# Altium footprint library LION.PcbLib: 90 footprints (part 6 of 13)
Each footprint in its own frame and in the unit in brackets; x right, y up, seen from the top. Pads: shape width x height; smd on the part's side, far side on the other; paste and mask are expansions set on the pad; w line width, h text height; cw(c..) or ccw(c..) is an arc to the next point about the centre after c.
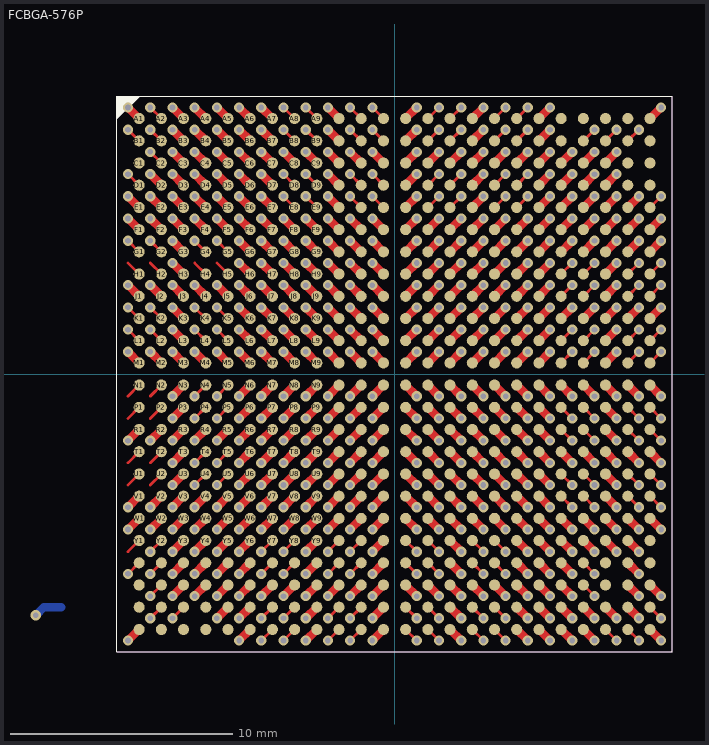
[diagram p5: the footprint, top view; thin cyan lines are the x and y axes]

## FCBGA-576P [mil] "FCBGA-576P"
pads (576):
  round 19.69 smd: A1(-452.76,452.76) A2(-413.39,452.76) A3(-374.02,452.76) A4(-334.65,452.76) A5(-295.28,452.76) A6(-255.91,452.76) A7(-216.54,452.76) A8(-177.17,452.76) A9(-137.8,452.76) A10(-98.43,452.76) A11(-59.06,452.76) A12(-19.69,452.76) A13(19.69,452.76) A14(59.06,452.76) A15(98.43,452.76) A16(137.8,452.76) A17(177.17,452.76) A18(216.54,452.76) A19(255.91,452.76) A20(295.28,452.76) A21(334.65,452.76) A22(374.02,452.76) A23(413.39,452.76) A24(452.76,452.76) AA1(-452.76,-334.65) AA2(-413.39,-334.65) AA3(-374.02,-334.65) AA4(-334.65,-334.65) AA5(-295.28,-334.65) AA6(-255.91,-334.65) AA7(-216.54,-334.65) AA8(-177.17,-334.65) AA9(-137.8,-334.65) AA10(-98.43,-334.65) AA11(-59.06,-334.65) AA12(-19.69,-334.65) AA13(19.69,-334.65) AA14(59.06,-334.65) AA15(98.43,-334.65) AA16(137.8,-334.65) AA17(177.17,-334.65) AA18(216.54,-334.65) AA19(255.91,-334.65) AA20(295.28,-334.65) AA21(334.65,-334.65) AA22(374.02,-334.65) AA23(413.39,-334.65) AA24(452.76,-334.65) AB1(-452.76,-374.02) AB2(-413.39,-374.02) AB3(-374.02,-374.02) AB4(-334.65,-374.02) AB5(-295.28,-374.02) AB6(-255.91,-374.02) AB7(-216.54,-374.02) AB8(-177.17,-374.02) AB9(-137.8,-374.02) AB10(-98.43,-374.02) AB11(-59.06,-374.02) AB12(-19.69,-374.02) AB13(19.69,-374.02) AB14(59.06,-374.02) AB15(98.43,-374.02) AB16(137.8,-374.02) AB17(177.17,-374.02) AB18(216.54,-374.02) AB19(255.91,-374.02) AB20(295.28,-374.02) AB21(334.65,-374.02) AB22(374.02,-374.02) AB23(413.39,-374.02) AB24(452.76,-374.02) AC1(-452.76,-413.39) AC2(-413.39,-413.39) AC3(-374.02,-413.39) AC4(-334.65,-413.39) AC5(-295.28,-413.39) AC6(-255.91,-413.39) AC7(-216.54,-413.39) AC8(-177.17,-413.39) AC9(-137.8,-413.39) AC10(-98.43,-413.39) AC11(-59.06,-413.39) AC12(-19.69,-413.39) AC13(19.69,-413.39) AC14(59.06,-413.39) AC15(98.43,-413.39) AC16(137.8,-413.39) AC17(177.17,-413.39) AC18(216.54,-413.39) AC19(255.91,-413.39) AC20(295.28,-413.39) AC21(334.65,-413.39) AC22(374.02,-413.39) AC23(413.39,-413.39) AC24(452.76,-413.39) AD1(-452.76,-452.76) AD2(-413.39,-452.76) AD3(-374.02,-452.76) AD4(-334.65,-452.76) AD5(-295.28,-452.76) AD6(-255.91,-452.76) AD7(-216.54,-452.76) AD8(-177.17,-452.76) AD9(-137.8,-452.76) AD10(-98.43,-452.76) AD11(-59.06,-452.76) AD12(-19.69,-452.76) AD13(19.69,-452.76) AD14(59.06,-452.76) AD15(98.43,-452.76) AD16(137.8,-452.76) AD17(177.17,-452.76) AD18(216.54,-452.76) AD19(255.91,-452.76) AD20(295.28,-452.76) AD21(334.65,-452.76) AD22(374.02,-452.76) AD23(413.39,-452.76) AD24(452.76,-452.76) B1(-452.76,413.39) B2(-413.39,413.39) B3(-374.02,413.39) B4(-334.65,413.39) B5(-295.28,413.39) B6(-255.91,413.39) B7(-216.54,413.39) B8(-177.17,413.39) B9(-137.8,413.39) B10(-98.43,413.39) B11(-59.06,413.39) B12(-19.69,413.39) B13(19.69,413.39) B14(59.06,413.39) B15(98.43,413.39) B16(137.8,413.39) B17(177.17,413.39) B18(216.54,413.39) B19(255.91,413.39) B20(295.28,413.39) B21(334.65,413.39) B22(374.02,413.39) B23(413.39,413.39) B24(452.76,413.39) C1(-452.76,374.02) C2(-413.39,374.02) C3(-374.02,374.02) C4(-334.65,374.02) C5(-295.28,374.02) C6(-255.91,374.02) C7(-216.54,374.02) C8(-177.17,374.02) C9(-137.8,374.02) C10(-98.43,374.02) C11(-59.06,374.02) C12(-19.69,374.02) C13(19.69,374.02) C14(59.06,374.02) C15(98.43,374.02) C16(137.8,374.02) C17(177.17,374.02) C18(216.54,374.02) C19(255.91,374.02) C20(295.28,374.02) C21(334.65,374.02) C22(374.02,374.02) C23(413.39,374.02) C24(452.76,374.02) D1(-452.76,334.65) D2(-413.39,334.65) D3(-374.02,334.65) D4(-334.65,334.65) D5(-295.28,334.65) D6(-255.91,334.65) D7(-216.54,334.65) D8(-177.17,334.65) D9(-137.8,334.65) D10(-98.43,334.65) D11(-59.06,334.65) D12(-19.69,334.65) D13(19.69,334.65) D14(59.06,334.65) D15(98.43,334.65) D16(137.8,334.65) D17(177.17,334.65) D18(216.54,334.65) D19(255.91,334.65) D20(295.28,334.65) D21(334.65,334.65) D22(374.02,334.65) D23(413.39,334.65) D24(452.76,334.65) E1(-452.76,295.28) E2(-413.39,295.28) E3(-374.02,295.28) E4(-334.65,295.28) E5(-295.28,295.28) E6(-255.91,295.28) E7(-216.54,295.28) E8(-177.17,295.28) E9(-137.8,295.28) E10(-98.43,295.28) E11(-59.06,295.28) E12(-19.69,295.28) E13(19.69,295.28) E14(59.06,295.28) E15(98.43,295.28) E16(137.8,295.28) E17(177.17,295.28) E18(216.54,295.28) E19(255.91,295.28) E20(295.28,295.28) E21(334.65,295.28) E22(374.02,295.28) E23(413.39,295.28) E24(452.76,295.28) F1(-452.76,255.91) F2(-413.39,255.91) F3(-374.02,255.91) F4(-334.65,255.91) F5(-295.28,255.91) F6(-255.91,255.91) F7(-216.54,255.91) F8(-177.17,255.91) F9(-137.8,255.91) F10(-98.43,255.91) F11(-59.06,255.91) F12(-19.69,255.91) F13(19.69,255.91) F14(59.06,255.91) F15(98.43,255.91) F16(137.8,255.91) F17(177.17,255.91) F18(216.54,255.91) F19(255.91,255.91) F20(295.28,255.91) F21(334.65,255.91) F22(374.02,255.91) F23(413.39,255.91) F24(452.76,255.91) G1(-452.76,216.54) G2(-413.39,216.54) G3(-374.02,216.54) G4(-334.65,216.54) G5(-295.28,216.54) G6(-255.91,216.54) G7(-216.54,216.54) G8(-177.17,216.54) G9(-137.8,216.54) G10(-98.43,216.54) G11(-59.06,216.54) G12(-19.69,216.54) G13(19.69,216.54) G14(59.06,216.54) G15(98.43,216.54) G16(137.8,216.54) G17(177.17,216.54) G18(216.54,216.54) G19(255.91,216.54) G20(295.28,216.54) G21(334.65,216.54) G22(374.02,216.54) G23(413.39,216.54) G24(452.76,216.54) H1(-452.76,177.17) H2(-413.39,177.17) H3(-374.02,177.17) H4(-334.65,177.17) H5(-295.28,177.17) H6(-255.91,177.17) H7(-216.54,177.17) H8(-177.17,177.17) H9(-137.8,177.17) H10(-98.43,177.17) H11(-59.06,177.17) H12(-19.69,177.17) H13(19.69,177.17) H14(59.06,177.17) H15(98.43,177.17) H16(137.8,177.17) H17(177.17,177.17) H18(216.54,177.17) H19(255.91,177.17) H20(295.28,177.17) H21(334.65,177.17) H22(374.02,177.17) H23(413.39,177.17) H24(452.76,177.17) J1(-452.76,137.8) J2(-413.39,137.8) J3(-374.02,137.8) J4(-334.65,137.8) J5(-295.28,137.8) J6(-255.91,137.8) J7(-216.54,137.8) J8(-177.17,137.8) J9(-137.8,137.8) J10(-98.43,137.8) J11(-59.06,137.8) J12(-19.69,137.8) J13(19.69,137.8) J14(59.06,137.8) J15(98.43,137.8) J16(137.8,137.8) J17(177.17,137.8) J18(216.54,137.8) J19(255.91,137.8) J20(295.28,137.8) J21(334.65,137.8) J22(374.02,137.8) J23(413.39,137.8) J24(452.76,137.8) K1(-452.76,98.43) K2(-413.39,98.43) K3(-374.02,98.43) K4(-334.65,98.43) K5(-295.28,98.43) K6(-255.91,98.43) K7(-216.54,98.43) K8(-177.17,98.43) K9(-137.8,98.43) K10(-98.43,98.43) K11(-59.06,98.43) K12(-19.69,98.43) K13(19.69,98.43) K14(59.06,98.43) K15(98.43,98.43) K16(137.8,98.43) K17(177.17,98.43) K18(216.54,98.43) K19(255.91,98.43) K20(295.28,98.43) K21(334.65,98.43) K22(374.02,98.43) K23(413.39,98.43) K24(452.76,98.43) L1(-452.76,59.06) L2(-413.39,59.06) L3(-374.02,59.06) L4(-334.65,59.06) L5(-295.28,59.06) L6(-255.91,59.06) L7(-216.54,59.06) L8(-177.17,59.06) L9(-137.8,59.06) L10(-98.43,59.06) L11(-59.06,59.06) L12(-19.69,59.06) L13(19.69,59.06) L14(59.06,59.06) L15(98.43,59.06) L16(137.8,59.06) L17(177.17,59.06) L18(216.54,59.06) L19(255.91,59.06) L20(295.28,59.06) L21(334.65,59.06) L22(374.02,59.06) L23(413.39,59.06) L24(452.76,59.06) M1(-452.76,19.69) M2(-413.39,19.69) M3(-374.02,19.69) M4(-334.65,19.69) M5(-295.28,19.69) M6(-255.91,19.69) M7(-216.54,19.69) M8(-177.17,19.69) M9(-137.8,19.69) M10(-98.43,19.69) M11(-59.06,19.69) M12(-19.69,19.69) M13(19.69,19.69) M14(59.06,19.69) M15(98.43,19.69) M16(137.8,19.69) M17(177.17,19.69) M18(216.54,19.69) M19(255.91,19.69) M20(295.28,19.69) M21(334.65,19.69) M22(374.02,19.69) M23(413.39,19.69) M24(452.76,19.69) N1(-452.76,-19.69) N2(-413.39,-19.69) N3(-374.02,-19.69) N4(-334.65,-19.69) N5(-295.28,-19.69) N6(-255.91,-19.69) N7(-216.54,-19.69) N8(-177.17,-19.69) N9(-137.8,-19.69) N10(-98.43,-19.69) N11(-59.06,-19.69) N12(-19.69,-19.69) N13(19.69,-19.69) N14(59.06,-19.69) N15(98.43,-19.69) N16(137.8,-19.69) N17(177.17,-19.69) N18(216.54,-19.69) N19(255.91,-19.69) N20(295.28,-19.69) N21(334.65,-19.69) N22(374.02,-19.69) N23(413.39,-19.69) N24(452.76,-19.69) P1(-452.76,-59.06) P2(-413.39,-59.06) P3(-374.02,-59.06) P4(-334.65,-59.06) P5(-295.28,-59.06) P6(-255.91,-59.06) P7(-216.54,-59.06) P8(-177.17,-59.06) P9(-137.8,-59.06) P10(-98.43,-59.06) P11(-59.06,-59.06) P12(-19.69,-59.06) P13(19.69,-59.06) P14(59.06,-59.06) P15(98.43,-59.06) P16(137.8,-59.06) P17(177.17,-59.06) P18(216.54,-59.06) P19(255.91,-59.06) P20(295.28,-59.06) P21(334.65,-59.06) P22(374.02,-59.06) P23(413.39,-59.06) P24(452.76,-59.06) R1(-452.76,-98.43) R2(-413.39,-98.43) R3(-374.02,-98.43) R4(-334.65,-98.43) R5(-295.28,-98.43) R6(-255.91,-98.43) R7(-216.54,-98.43) R8(-177.17,-98.43) R9(-137.8,-98.43) R10(-98.43,-98.43) R11(-59.06,-98.43) R12(-19.69,-98.43) R13(19.69,-98.43) R14(59.06,-98.43) R15(98.43,-98.43) R16(137.8,-98.43) R17(177.17,-98.43) R18(216.54,-98.43) R19(255.91,-98.43) R20(295.28,-98.43) R21(334.65,-98.43) R22(374.02,-98.43) R23(413.39,-98.43) R24(452.76,-98.43) T1(-452.76,-137.8) T2(-413.39,-137.8) T3(-374.02,-137.8) T4(-334.65,-137.8) T5(-295.28,-137.8) T6(-255.91,-137.8) T7(-216.54,-137.8) T8(-177.17,-137.8) T9(-137.8,-137.8) T10(-98.43,-137.8) T11(-59.06,-137.8) T12(-19.69,-137.8) T13(19.69,-137.8) T14(59.06,-137.8) T15(98.43,-137.8) T16(137.8,-137.8) T17(177.17,-137.8) T18(216.54,-137.8) T19(255.91,-137.8) T20(295.28,-137.8) T21(334.65,-137.8) T22(374.02,-137.8) T23(413.39,-137.8) T24(452.76,-137.8) U1(-452.76,-177.17) U2(-413.39,-177.17) U3(-374.02,-177.17) U4(-334.65,-177.17) U5(-295.28,-177.17) U6(-255.91,-177.17) U7(-216.54,-177.17) U8(-177.17,-177.17) U9(-137.8,-177.17) U10(-98.43,-177.17) U11(-59.06,-177.17) U12(-19.69,-177.17) U13(19.69,-177.17) U14(59.06,-177.17) U15(98.43,-177.17) U16(137.8,-177.17) U17(177.17,-177.17) U18(216.54,-177.17) U19(255.91,-177.17) U20(295.28,-177.17) U21(334.65,-177.17) U22(374.02,-177.17) U23(413.39,-177.17) U24(452.76,-177.17) V1(-452.76,-216.54) V2(-413.39,-216.54) V3(-374.02,-216.54) V4(-334.65,-216.54) V5(-295.28,-216.54) V6(-255.91,-216.54) V7(-216.54,-216.54) V8(-177.17,-216.54) V9(-137.8,-216.54) V10(-98.43,-216.54) V11(-59.06,-216.54) V12(-19.69,-216.54) V13(19.69,-216.54) V14(59.06,-216.54) V15(98.43,-216.54) V16(137.8,-216.54) V17(177.17,-216.54) V18(216.54,-216.54) V19(255.91,-216.54) V20(295.28,-216.54) V21(334.65,-216.54) V22(374.02,-216.54) V23(413.39,-216.54) V24(452.76,-216.54) W1(-452.76,-255.91) W2(-413.39,-255.91) W3(-374.02,-255.91) W4(-334.65,-255.91) W5(-295.28,-255.91) W6(-255.91,-255.91) W7(-216.54,-255.91) W8(-177.17,-255.91) W9(-137.8,-255.91) W10(-98.43,-255.91) W11(-59.06,-255.91) W12(-19.69,-255.91) W13(19.69,-255.91) W14(59.06,-255.91) W15(98.43,-255.91) W16(137.8,-255.91) W17(177.17,-255.91) W18(216.54,-255.91) W19(255.91,-255.91) W20(295.28,-255.91) W21(334.65,-255.91) W22(374.02,-255.91) W23(413.39,-255.91) W24(452.76,-255.91) Y1(-452.76,-295.28) Y2(-413.39,-295.28) Y3(-374.02,-295.28) Y4(-334.65,-295.28) Y5(-295.28,-295.28) Y6(-255.91,-295.28) Y7(-216.54,-295.28) Y8(-177.17,-295.28) Y9(-137.8,-295.28) Y10(-98.43,-295.28) Y11(-59.06,-295.28) Y12(-19.69,-295.28) Y13(19.69,-295.28) Y14(59.06,-295.28) Y15(98.43,-295.28) Y16(137.8,-295.28) Y17(177.17,-295.28) Y18(216.54,-295.28) Y19(255.91,-295.28) Y20(295.28,-295.28) Y21(334.65,-295.28) Y22(374.02,-295.28) Y23(413.39,-295.28) Y24(452.76,-295.28)
via -433.07,236.22 diameter 18 hole 10
via -472.44,118.11 diameter 18 hole 10
via -433.07,118.11 diameter 18 hole 10
via -472.44,236.22 diameter 18 hole 10
via -472.44,78.74 diameter 18 hole 10
via -433.07,78.74 diameter 18 hole 10
via -196.85,-314.96 diameter 18 hole 10
via -78.74,-354.33 diameter 18 hole 10
via -236.22,-354.33 diameter 18 hole 10
via -118.11,-354.33 diameter 18 hole 10
via -78.74,-314.96 diameter 18 hole 10
via -196.85,-354.33 diameter 18 hole 10
via -118.11,-314.96 diameter 18 hole 10
via -236.22,-314.96 diameter 18 hole 10
via 433.07,-196.85 diameter 18 hole 10
via 472.44,-196.85 diameter 18 hole 10
via 433.07,-118.11 diameter 18 hole 10
via 472.44,-118.11 diameter 18 hole 10
via 472.44,-78.74 diameter 18 hole 10
via 433.07,-78.74 diameter 18 hole 10
via 472.44,-236.22 diameter 18 hole 10
via 433.07,-236.22 diameter 18 hole 10
via -196.85,472.44 diameter 18 hole 10
via -196.85,433.07 diameter 18 hole 10
via -157.48,472.44 diameter 18 hole 10
via -157.48,433.07 diameter 18 hole 10
via -78.74,472.44 diameter 18 hole 10
via -78.74,433.07 diameter 18 hole 10
via -39.37,472.44 diameter 18 hole 10
via -39.37,433.07 diameter 18 hole 10
via 472.44,196.85 diameter 18 hole 10
via 433.07,196.85 diameter 18 hole 10
via 472.44,157.48 diameter 18 hole 10
via 433.07,157.48 diameter 18 hole 10
via 472.44,78.74 diameter 18 hole 10
via 433.07,78.74 diameter 18 hole 10
via 472.44,39.37 diameter 18 hole 10
via 433.07,39.37 diameter 18 hole 10
via 78.74,472.44 diameter 18 hole 10
via 78.74,433.07 diameter 18 hole 10
via 118.11,472.44 diameter 18 hole 10
via 118.11,433.07 diameter 18 hole 10
via 196.85,472.44 diameter 18 hole 10
via 196.85,433.07 diameter 18 hole 10
via 236.22,472.44 diameter 18 hole 10
via 236.22,433.07 diameter 18 hole 10
via 39.37,-314.96 diameter 18 hole 10
via -314.96,78.74 diameter 18 hole 10
via 78.74,314.96 diameter 18 hole 10
via -354.33,-78.74 diameter 18 hole 10
via -314.96,-196.85 diameter 18 hole 10
via -39.37,314.96 diameter 18 hole 10
via 314.96,78.74 diameter 18 hole 10
via 354.33,39.37 diameter 18 hole 10
via -78.74,354.33 diameter 18 hole 10
via -354.33,236.22 diameter 18 hole 10
via 39.37,-354.33 diameter 18 hole 10
via 314.96,39.37 diameter 18 hole 10
via 314.96,-118.11 diameter 18 hole 10
via 354.33,196.85 diameter 18 hole 10
via -157.48,354.33 diameter 18 hole 10
via -314.96,-78.74 diameter 18 hole 10
via 354.33,-78.74 diameter 18 hole 10
via 236.22,354.33 diameter 18 hole 10
via 354.33,-393.7 diameter 18 hole 10
via -39.37,354.33 diameter 18 hole 10
via 354.33,157.48 diameter 18 hole 10
via -472.44,-354.33 diameter 18 hole 10
via 157.48,-314.96 diameter 18 hole 10
via -196.85,354.33 diameter 18 hole 10
via -314.96,118.11 diameter 18 hole 10
via -314.96,-39.37 diameter 18 hole 10
via 354.33,78.74 diameter 18 hole 10
via 78.74,-354.33 diameter 18 hole 10
via 354.33,-354.33 diameter 18 hole 10
via 196.85,314.96 diameter 18 hole 10
via 78.74,-314.96 diameter 18 hole 10
via 196.85,-314.96 diameter 18 hole 10
via -157.48,314.96 diameter 18 hole 10
via -78.74,314.96 diameter 18 hole 10
via -314.96,-157.48 diameter 18 hole 10
via -433.07,433.07 diameter 18 hole 10
via 314.96,-78.74 diameter 18 hole 10
via 314.96,-196.85 diameter 18 hole 10
via -433.07,-354.33 diameter 18 hole 10
via -433.07,-393.7 diameter 18 hole 10
via 118.11,314.96 diameter 18 hole 10
via -433.07,-433.07 diameter 18 hole 10
via -354.33,118.11 diameter 18 hole 10
via -354.33,-157.48 diameter 18 hole 10
via -354.33,-39.37 diameter 18 hole 10
via 118.11,354.33 diameter 18 hole 10
via -354.33,-196.85 diameter 18 hole 10
via 354.33,-236.22 diameter 18 hole 10
via 314.96,196.85 diameter 18 hole 10
via -354.33,78.74 diameter 18 hole 10
via 354.33,-118.11 diameter 18 hole 10
via -393.7,-433.07 diameter 18 hole 10
via -196.85,314.96 diameter 18 hole 10
via -314.96,236.22 diameter 18 hole 10
via 157.48,-354.33 diameter 18 hole 10
via -472.44,433.07 diameter 18 hole 10
via 314.96,157.48 diameter 18 hole 10
via 78.74,354.33 diameter 18 hole 10
via 236.22,314.96 diameter 18 hole 10
via -433.07,472.44 diameter 18 hole 10
via -472.44,354.33 diameter 18 hole 10
via 196.85,-354.33 diameter 18 hole 10
via -433.07,393.7 diameter 18 hole 10
via 314.96,-236.22 diameter 18 hole 10
via 354.33,-196.85 diameter 18 hole 10
via 196.85,354.33 diameter 18 hole 10
via -275.59,-433.07 diameter 18 hole 10
via -275.59,-472.44 diameter 18 hole 10
via -157.48,-472.44 diameter 18 hole 10
via -157.48,-433.07 diameter 18 hole 10
via -39.37,-433.07 diameter 18 hole 10
via -39.37,-472.44 diameter 18 hole 10
via 118.11,-433.07 diameter 18 hole 10
via 118.11,-472.44 diameter 18 hole 10
via 236.22,-472.44 diameter 18 hole 10
via 236.22,-433.07 diameter 18 hole 10
via -433.07,-236.22 diameter 18 hole 10
via -433.07,-118.11 diameter 18 hole 10
via -472.44,-118.11 diameter 18 hole 10
via -472.44,-236.22 diameter 18 hole 10
via 433.07,-275.59 diameter 18 hole 10
via 472.44,-275.59 diameter 18 hole 10
via 433.07,-157.48 diameter 18 hole 10
via 472.44,-157.48 diameter 18 hole 10
via -433.07,157.48 diameter 18 hole 10
via -472.44,157.48 diameter 18 hole 10
via -472.44,39.37 diameter 18 hole 10
via -433.07,39.37 diameter 18 hole 10
via 472.44,236.22 diameter 18 hole 10
via 433.07,236.22 diameter 18 hole 10
via 433.07,118.11 diameter 18 hole 10
via 472.44,118.11 diameter 18 hole 10
via -472.44,275.59 diameter 18 hole 10
via -433.07,275.59 diameter 18 hole 10
via -118.11,472.44 diameter 18 hole 10
via -118.11,433.07 diameter 18 hole 10
via 39.37,472.44 diameter 18 hole 10
via 39.37,433.07 diameter 18 hole 10
via -236.22,433.07 diameter 18 hole 10
via -236.22,472.44 diameter 18 hole 10
via 157.48,472.44 diameter 18 hole 10
via 275.59,472.44 diameter 18 hole 10
via 275.59,433.07 diameter 18 hole 10
via 157.48,433.07 diameter 18 hole 10
via 433.07,-39.37 diameter 18 hole 10
via 472.44,-39.37 diameter 18 hole 10
via -354.33,-275.59 diameter 18 hole 10
via -314.96,-275.59 diameter 18 hole 10
via -157.48,-314.96 diameter 18 hole 10
via -157.48,-354.33 diameter 18 hole 10
via -157.48,-275.59 diameter 18 hole 10
via 118.11,-354.33 diameter 18 hole 10
via 118.11,-314.96 diameter 18 hole 10
via 118.11,-275.59 diameter 18 hole 10
via 275.59,-157.48 diameter 18 hole 10
via 275.59,-314.96 diameter 18 hole 10
via -314.96,-118.11 diameter 18 hole 10
via -354.33,-118.11 diameter 18 hole 10
via -275.59,-118.11 diameter 18 hole 10
via 275.59,-354.33 diameter 18 hole 10
via 433.07,-393.7 diameter 18 hole 10
via 433.07,-354.33 diameter 18 hole 10
via -314.96,314.96 diameter 18 hole 10
via -275.59,314.96 diameter 18 hole 10
via 157.48,275.59 diameter 18 hole 10
via -118.11,275.59 diameter 18 hole 10
via 157.48,314.96 diameter 18 hole 10
via 157.48,354.33 diameter 18 hole 10
via -118.11,314.96 diameter 18 hole 10
via -118.11,354.33 diameter 18 hole 10
via -354.33,157.48 diameter 18 hole 10
via -314.96,157.48 diameter 18 hole 10
via -275.59,157.48 diameter 18 hole 10
via 314.96,-157.48 diameter 18 hole 10
via 354.33,-157.48 diameter 18 hole 10
via 275.59,118.11 diameter 18 hole 10
via 314.96,118.11 diameter 18 hole 10
via 354.33,118.11 diameter 18 hole 10
via 354.33,275.59 diameter 18 hole 10
via 314.96,275.59 diameter 18 hole 10
via -275.59,-275.59 diameter 18 hole 10
via -275.59,-314.96 diameter 18 hole 10
via -275.59,-354.33 diameter 18 hole 10
via -354.33,-236.22 diameter 18 hole 10
via -314.96,-236.22 diameter 18 hole 10
via 236.22,-314.96 diameter 18 hole 10
via 236.22,-354.33 diameter 18 hole 10
via 393.7,-314.96 diameter 18 hole 10
via 314.96,-275.59 diameter 18 hole 10
via 354.33,-275.59 diameter 18 hole 10
via 275.59,-275.59 diameter 18 hole 10
via -39.37,-275.59 diameter 18 hole 10
via -39.37,-354.33 diameter 18 hole 10
via -39.37,-314.96 diameter 18 hole 10
via -236.22,354.33 diameter 18 hole 10
via -236.22,314.96 diameter 18 hole 10
via -275.59,275.59 diameter 18 hole 10
via -354.33,275.59 diameter 18 hole 10
via -314.96,275.59 diameter 18 hole 10
via -393.7,314.96 diameter 18 hole 10
via -275.59,39.37 diameter 18 hole 10
via -314.96,39.37 diameter 18 hole 10
via -354.33,39.37 diameter 18 hole 10
via 275.59,314.96 diameter 18 hole 10
via 275.59,275.59 diameter 18 hole 10
via 275.59,354.33 diameter 18 hole 10
via 39.37,354.33 diameter 18 hole 10
via 39.37,314.96 diameter 18 hole 10
via 39.37,275.59 diameter 18 hole 10
via 275.59,-39.37 diameter 18 hole 10
via 314.96,-39.37 diameter 18 hole 10
via 354.33,-39.37 diameter 18 hole 10
via 314.96,236.22 diameter 18 hole 10
via 354.33,236.22 diameter 18 hole 10
via -118.11,-236.22 diameter 18 hole 10
via -78.74,-236.22 diameter 18 hole 10
via -196.85,-157.48 diameter 18 hole 10
via -157.48,-157.48 diameter 18 hole 10
via -157.48,-196.85 diameter 18 hole 10
via -236.22,-236.22 diameter 18 hole 10
via -196.85,-196.85 diameter 18 hole 10
via -78.74,-78.74 diameter 18 hole 10
via -78.74,-118.11 diameter 18 hole 10
via -118.11,-78.74 diameter 18 hole 10
via -118.11,-118.11 diameter 18 hole 10
via -236.22,78.74 diameter 18 hole 10
via -236.22,-78.74 diameter 18 hole 10
via -118.11,78.74 diameter 18 hole 10
via -118.11,118.11 diameter 18 hole 10
via -157.48,39.37 diameter 18 hole 10
via -196.85,39.37 diameter 18 hole 10
via -78.74,118.11 diameter 18 hole 10
via -78.74,78.74 diameter 18 hole 10
via -196.85,-39.37 diameter 18 hole 10
via -157.48,-39.37 diameter 18 hole 10
via -236.22,118.11 diameter 18 hole 10
via -196.85,157.48 diameter 18 hole 10
via -157.48,157.48 diameter 18 hole 10
via -39.37,157.48 diameter 18 hole 10
via -78.74,236.22 diameter 18 hole 10
via -39.37,196.85 diameter 18 hole 10
via -236.22,236.22 diameter 18 hole 10
via -196.85,196.85 diameter 18 hole 10
via -157.48,196.85 diameter 18 hole 10
via 78.74,-236.22 diameter 18 hole 10
via 39.37,-196.85 diameter 18 hole 10
via 39.37,-157.48 diameter 18 hole 10
via -39.37,-157.48 diameter 18 hole 10
via -39.37,-196.85 diameter 18 hole 10
via 78.74,-78.74 diameter 18 hole 10
via 78.74,-118.11 diameter 18 hole 10
via 236.22,-236.22 diameter 18 hole 10
via 157.48,-157.48 diameter 18 hole 10
via 196.85,-157.48 diameter 18 hole 10
via 157.48,-196.85 diameter 18 hole 10
via 196.85,-196.85 diameter 18 hole 10
via 236.22,-118.11 diameter 18 hole 10
via 118.11,-78.74 diameter 18 hole 10
via 118.11,-118.11 diameter 18 hole 10
via 78.74,78.74 diameter 18 hole 10
via 78.74,118.11 diameter 18 hole 10
via 39.37,39.37 diameter 18 hole 10
via -39.37,39.37 diameter 18 hole 10
via 39.37,-39.37 diameter 18 hole 10
via -39.37,-39.37 diameter 18 hole 10
via 39.37,157.48 diameter 18 hole 10
via 78.74,236.22 diameter 18 hole 10
via 39.37,196.85 diameter 18 hole 10
via 236.22,-78.74 diameter 18 hole 10
via 157.48,39.37 diameter 18 hole 10
via 196.85,39.37 diameter 18 hole 10
via 236.22,78.74 diameter 18 hole 10
via 118.11,118.11 diameter 18 hole 10
via 118.11,78.74 diameter 18 hole 10
via 196.85,-39.37 diameter 18 hole 10
via 157.48,-39.37 diameter 18 hole 10
via 157.48,157.48 diameter 18 hole 10
via 196.85,157.48 diameter 18 hole 10
via 157.48,196.85 diameter 18 hole 10
via 196.85,196.85 diameter 18 hole 10
via 236.22,236.22 diameter 18 hole 10
via 118.11,236.22 diameter 18 hole 10
via 78.74,-433.07 diameter 18 hole 10
via 39.37,-472.44 diameter 18 hole 10
via 196.85,-433.07 diameter 18 hole 10
via 157.48,-472.44 diameter 18 hole 10
via 39.37,-433.07 diameter 18 hole 10
via 196.85,-472.44 diameter 18 hole 10
via 157.48,-433.07 diameter 18 hole 10
via 78.74,-472.44 diameter 18 hole 10
via -118.11,-472.44 diameter 18 hole 10
via -118.11,-433.07 diameter 18 hole 10
via -236.22,-433.07 diameter 18 hole 10
via -78.74,-472.44 diameter 18 hole 10
via -78.74,-433.07 diameter 18 hole 10
via -196.85,-433.07 diameter 18 hole 10
via -196.85,-472.44 diameter 18 hole 10
via -236.22,-472.44 diameter 18 hole 10
via 472.44,-433.07 diameter 18 hole 10
via 433.07,-472.44 diameter 18 hole 10
via 393.7,-472.44 diameter 18 hole 10
via 433.07,433.07 diameter 18 hole 10
via -433.07,-314.96 diameter 18 hole 10
via 393.7,433.07 diameter 18 hole 10
via 354.33,433.07 diameter 18 hole 10
via 472.44,314.96 diameter 18 hole 10
via -635.92,-427.69 diameter 18 hole 10
via -393.7,-393.7 diameter 18 hole 10
via -354.33,-393.7 diameter 18 hole 10
via -314.96,-433.07 diameter 18 hole 10
via -393.7,-354.33 diameter 18 hole 10
via 314.96,-393.7 diameter 18 hole 10
via 275.59,-472.44 diameter 18 hole 10
via 314.96,-433.07 diameter 18 hole 10
via 314.96,-472.44 diameter 18 hole 10
via 275.59,-433.07 diameter 18 hole 10
via 354.33,-472.44 diameter 18 hole 10
via 314.96,-314.96 diameter 18 hole 10
via -433.07,314.96 diameter 18 hole 10
via -354.33,354.33 diameter 18 hole 10
via -393.7,354.33 diameter 18 hole 10
via 433.07,314.96 diameter 18 hole 10
via 393.7,354.33 diameter 18 hole 10
via 354.33,393.7 diameter 18 hole 10
via 393.7,393.7 diameter 18 hole 10
via -472.44,-472.44 diameter 18 hole 10
via 393.7,-433.07 diameter 18 hole 10
via 433.07,-433.07 diameter 18 hole 10
via 354.33,-433.07 diameter 18 hole 10
via 472.44,-472.44 diameter 18 hole 10
via -393.7,-236.22 diameter 18 hole 10
via -393.7,-275.59 diameter 18 hole 10
via -275.59,-236.22 diameter 18 hole 10
via -275.59,-157.48 diameter 18 hole 10
via -393.7,-314.96 diameter 18 hole 10
via -354.33,-314.96 diameter 18 hole 10
via -314.96,-314.96 diameter 18 hole 10
via -393.7,-196.85 diameter 18 hole 10
via -275.59,-196.85 diameter 18 hole 10
via -354.33,-354.33 diameter 18 hole 10
via -314.96,-354.33 diameter 18 hole 10
via -314.96,-393.7 diameter 18 hole 10
via -275.59,-393.7 diameter 18 hole 10
via -433.07,-275.59 diameter 18 hole 10
via -472.44,-275.59 diameter 18 hole 10
via -393.7,-118.11 diameter 18 hole 10
via -393.7,-157.48 diameter 18 hole 10
via -236.22,-275.59 diameter 18 hole 10
via -196.85,-275.59 diameter 18 hole 10
via -118.11,-275.59 diameter 18 hole 10
via -78.74,-275.59 diameter 18 hole 10
via 39.37,-275.59 diameter 18 hole 10
via 78.74,-275.59 diameter 18 hole 10
via -39.37,-236.22 diameter 18 hole 10
via -118.11,-196.85 diameter 18 hole 10
via -157.48,-236.22 diameter 18 hole 10
via -236.22,-118.11 diameter 18 hole 10
via 78.74,-393.7 diameter 18 hole 10
via 39.37,-393.7 diameter 18 hole 10
via -39.37,-393.7 diameter 18 hole 10
via -78.74,-393.7 diameter 18 hole 10
via -118.11,-393.7 diameter 18 hole 10
via -157.48,-393.7 diameter 18 hole 10
via -196.85,-393.7 diameter 18 hole 10
via -236.22,-393.7 diameter 18 hole 10
via 78.74,-157.48 diameter 18 hole 10
via 78.74,-196.85 diameter 18 hole 10
via 39.37,-236.22 diameter 18 hole 10
via -196.85,-236.22 diameter 18 hole 10
via -78.74,-196.85 diameter 18 hole 10
via -78.74,-157.48 diameter 18 hole 10
via -118.11,-157.48 diameter 18 hole 10
via -236.22,-157.48 diameter 18 hole 10
via 39.37,-118.11 diameter 18 hole 10
via 39.37,-78.74 diameter 18 hole 10
via -39.37,-118.11 diameter 18 hole 10
via -39.37,-78.74 diameter 18 hole 10
via -157.48,-118.11 diameter 18 hole 10
via -157.48,-78.74 diameter 18 hole 10
via -236.22,-196.85 diameter 18 hole 10
via -196.85,-118.11 diameter 18 hole 10
via 196.85,-393.7 diameter 18 hole 10
via 157.48,-275.59 diameter 18 hole 10
via 196.85,-275.59 diameter 18 hole 10
via 236.22,-275.59 diameter 18 hole 10
via 275.59,-236.22 diameter 18 hole 10
via 157.48,-236.22 diameter 18 hole 10
via 118.11,-236.22 diameter 18 hole 10
via 236.22,-157.48 diameter 18 hole 10
via 393.7,-157.48 diameter 18 hole 10
via 393.7,-196.85 diameter 18 hole 10
via 393.7,-236.22 diameter 18 hole 10
via 275.59,-196.85 diameter 18 hole 10
via 275.59,-118.11 diameter 18 hole 10
via 393.7,-118.11 diameter 18 hole 10
via 314.96,-354.33 diameter 18 hole 10
via 393.7,-275.59 diameter 18 hole 10
via 354.33,-314.96 diameter 18 hole 10
via 157.48,-393.7 diameter 18 hole 10
via 118.11,-393.7 diameter 18 hole 10
via 236.22,-393.7 diameter 18 hole 10
via 275.59,-393.7 diameter 18 hole 10
via 196.85,-236.22 diameter 18 hole 10
via 118.11,-196.85 diameter 18 hole 10
via 118.11,-157.48 diameter 18 hole 10
via 196.85,-118.11 diameter 18 hole 10
via 196.85,-78.74 diameter 18 hole 10
via 157.48,-118.11 diameter 18 hole 10
via 157.48,-78.74 diameter 18 hole 10
via 236.22,-196.85 diameter 18 hole 10
via 472.44,-393.7 diameter 18 hole 10
via 433.07,-314.96 diameter 18 hole 10
via -275.59,-39.37 diameter 18 hole 10
via -275.59,-78.74 diameter 18 hole 10
via -393.7,39.37 diameter 18 hole 10
via -393.7,-39.37 diameter 18 hole 10
via -275.59,196.85 diameter 18 hole 10
via -275.59,236.22 diameter 18 hole 10
via -393.7,-78.74 diameter 18 hole 10
via -393.7,78.74 diameter 18 hole 10
via -275.59,118.11 diameter 18 hole 10
via -275.59,78.74 diameter 18 hole 10
via -393.7,118.11 diameter 18 hole 10
via -393.7,196.85 diameter 18 hole 10
via -393.7,157.48 diameter 18 hole 10
via -393.7,236.22 diameter 18 hole 10
via -236.22,39.37 diameter 18 hole 10
via -236.22,157.48 diameter 18 hole 10
via 39.37,236.22 diameter 18 hole 10
via -157.48,236.22 diameter 18 hole 10
via -118.11,236.22 diameter 18 hole 10
via -196.85,-78.74 diameter 18 hole 10
via 78.74,39.37 diameter 18 hole 10
via 118.11,39.37 diameter 18 hole 10
via -78.74,39.37 diameter 18 hole 10
via -157.48,78.74 diameter 18 hole 10
via -118.11,39.37 diameter 18 hole 10
via -196.85,236.22 diameter 18 hole 10
via -39.37,78.74 diameter 18 hole 10
via -39.37,118.11 diameter 18 hole 10
via 39.37,78.74 diameter 18 hole 10
via 39.37,118.11 diameter 18 hole 10
via -196.85,118.11 diameter 18 hole 10
via -157.48,118.11 diameter 18 hole 10
via 78.74,-39.37 diameter 18 hole 10
via -78.74,-39.37 diameter 18 hole 10
via -118.11,-39.37 diameter 18 hole 10
via -236.22,-39.37 diameter 18 hole 10
via -196.85,78.74 diameter 18 hole 10
via 78.74,157.48 diameter 18 hole 10
via -78.74,157.48 diameter 18 hole 10
via -118.11,157.48 diameter 18 hole 10
via 78.74,196.85 diameter 18 hole 10
via -118.11,196.85 diameter 18 hole 10
via -78.74,196.85 diameter 18 hole 10
via -236.22,196.85 diameter 18 hole 10
via -39.37,236.22 diameter 18 hole 10
via 275.59,-78.74 diameter 18 hole 10
via 393.7,39.37 diameter 18 hole 10
via 275.59,39.37 diameter 18 hole 10
via 393.7,78.74 diameter 18 hole 10
via 236.22,-39.37 diameter 18 hole 10
via 275.59,78.74 diameter 18 hole 10
via 236.22,118.11 diameter 18 hole 10
via 393.7,118.11 diameter 18 hole 10
via 393.7,157.48 diameter 18 hole 10
via 275.59,157.48 diameter 18 hole 10
via 275.59,196.85 diameter 18 hole 10
via 393.7,196.85 diameter 18 hole 10
via 275.59,236.22 diameter 18 hole 10
via 393.7,236.22 diameter 18 hole 10
via 157.48,236.22 diameter 18 hole 10
via 196.85,78.74 diameter 18 hole 10
via 236.22,39.37 diameter 18 hole 10
via 157.48,118.11 diameter 18 hole 10
via 196.85,118.11 diameter 18 hole 10
via 118.11,-39.37 diameter 18 hole 10
via 157.48,78.74 diameter 18 hole 10
via 236.22,157.48 diameter 18 hole 10
via 118.11,196.85 diameter 18 hole 10
via 118.11,157.48 diameter 18 hole 10
via 236.22,196.85 diameter 18 hole 10
via 196.85,236.22 diameter 18 hole 10
via 393.7,-78.74 diameter 18 hole 10
via 393.7,-39.37 diameter 18 hole 10
via -393.7,275.59 diameter 18 hole 10
via -314.96,393.7 diameter 18 hole 10
via -314.96,354.33 diameter 18 hole 10
via -275.59,354.33 diameter 18 hole 10
via -275.59,433.07 diameter 18 hole 10
via -236.22,393.7 diameter 18 hole 10
via -275.59,393.7 diameter 18 hole 10
via -275.59,472.44 diameter 18 hole 10
via -314.96,472.44 diameter 18 hole 10
via -354.33,472.44 diameter 18 hole 10
via -393.7,472.44 diameter 18 hole 10
via -472.44,472.44 diameter 18 hole 10
via -472.44,314.96 diameter 18 hole 10
via -314.96,433.07 diameter 18 hole 10
via -354.33,433.07 diameter 18 hole 10
via -393.7,433.07 diameter 18 hole 10
via -393.7,393.7 diameter 18 hole 10
via -354.33,393.7 diameter 18 hole 10
via -433.07,354.33 diameter 18 hole 10
via -354.33,314.96 diameter 18 hole 10
via -236.22,275.59 diameter 18 hole 10
via -196.85,275.59 diameter 18 hole 10
via -157.48,275.59 diameter 18 hole 10
via -78.74,275.59 diameter 18 hole 10
via -39.37,275.59 diameter 18 hole 10
via 78.74,275.59 diameter 18 hole 10
via -196.85,393.7 diameter 18 hole 10
via -157.48,393.7 diameter 18 hole 10
via -118.11,393.7 diameter 18 hole 10
via -78.74,393.7 diameter 18 hole 10
via -39.37,393.7 diameter 18 hole 10
via 39.37,393.7 diameter 18 hole 10
via 78.74,393.7 diameter 18 hole 10
via 118.11,275.59 diameter 18 hole 10
via 196.85,275.59 diameter 18 hole 10
via 354.33,314.96 diameter 18 hole 10
via 314.96,314.96 diameter 18 hole 10
via 236.22,275.59 diameter 18 hole 10
via 393.7,275.59 diameter 18 hole 10
via 314.96,354.33 diameter 18 hole 10
via 118.11,393.7 diameter 18 hole 10
via 196.85,393.7 diameter 18 hole 10
via 157.48,393.7 diameter 18 hole 10
via 275.59,393.7 diameter 18 hole 10
via 236.22,393.7 diameter 18 hole 10
via 393.7,314.96 diameter 18 hole 10
via 354.33,354.33 diameter 18 hole 10
via 314.96,393.7 diameter 18 hole 10
via 433.07,275.59 diameter 18 hole 10
via 472.44,275.59 diameter 18 hole 10
via 472.44,472.44 diameter 18 hole 10
Top Layer:
  lines w5: -472.44,-354.33 -452.76,-334.65 ; -472.44,-314.96 -452.76,-295.28 ; -472.44,-196.85 -452.76,-177.17 ; -472.44,-157.48 -452.76,-137.8 ; -472.44,-78.74 -452.76,-59.06 ; -472.44,-39.37 -452.76,-19.69 ; -472.44,78.74 -452.76,59.06 ; -472.44,118.11 -452.76,98.43 ; -472.44,196.85 -452.76,177.17 ; -472.44,236.22 -452.76,216.54 ; -472.44,354.33 -452.76,334.65 ; -472.44,433.07 -452.76,413.39 ; -433.07,-433.07 -413.39,-413.39 ; -433.07,-393.7 -413.39,-374.02 ; -433.07,-354.33 -413.39,-334.65 ; -433.07,-314.96 -413.39,-295.28 ; -433.07,-196.85 -413.39,-177.17 ; -433.07,-157.48 -413.39,-137.8 ; -433.07,-78.74 -413.39,-59.06 ; -433.07,-39.37 -413.39,-19.69 ; -433.07,78.74 -413.39,59.06 ; -433.07,118.11 -413.39,98.43 ; -433.07,196.85 -413.39,177.17 ; -433.07,236.22 -413.39,216.54 ; -433.07,393.7 -413.39,374.02 ; -433.07,433.07 -413.39,413.39 ; -433.07,472.44 -413.39,452.76 ; -393.7,-433.07 -374.02,-413.39 ; -354.33,-196.85 -334.65,-177.17 ; -354.33,-157.48 -334.65,-137.8 ; -354.33,-78.74 -334.65,-59.06 ; -354.33,-39.37 -334.65,-19.69 ; -354.33,78.74 -334.65,59.06 ; -354.33,118.11 -334.65,98.43 ; -354.33,196.85 -334.65,177.17 ; -354.33,236.22 -334.65,216.54 ; -314.96,-196.85 -295.28,-177.17 ; -314.96,-157.48 -295.28,-137.8 ; -314.96,-78.74 -295.28,-59.06 ; -314.96,-39.37 -295.28,-19.69 ; -314.96,78.74 -295.28,59.06 ; -314.96,118.11 -295.28,98.43 ; -314.96,196.85 -295.28,177.17 ; -314.96,236.22 -295.28,216.54 ; -236.22,-472.44 -216.54,-452.76 ; -236.22,-433.07 -216.54,-413.39 ; -236.22,-354.33 -216.54,-334.65 ; -236.22,-314.96 -216.54,-295.28 ; -196.85,-472.44 -177.17,-452.76 ; -196.85,-433.07 -177.17,-413.39 ; -196.85,-354.33 -177.17,-334.65 ; -196.85,-314.96 -177.17,-295.28 ; -196.85,314.96 -177.17,295.28 ; -196.85,354.33 -177.17,334.65 ; -196.85,433.07 -177.17,413.39 ; -196.85,472.44 -177.17,452.76 ; -157.48,314.96 -137.8,295.28 ; -157.48,354.33 -137.8,334.65 ; -157.48,433.07 -137.8,413.39 ; -157.48,472.44 -137.8,452.76 ; -118.11,-472.44 -98.43,-452.76 ; -118.11,-433.07 -98.43,-413.39 ; -118.11,-354.33 -98.43,-334.65 ; -118.11,-314.96 -98.43,-295.28 ; -78.74,-472.44 -59.06,-452.76 ; -78.74,-433.07 -59.06,-413.39 ; -78.74,-354.33 -59.06,-334.65 ; -78.74,-314.96 -59.06,-295.28 ; -78.74,314.96 -59.06,295.28 ; -78.74,354.33 -59.06,334.65 ; -78.74,433.07 -59.06,413.39 ; -78.74,472.44 -59.06,452.76 ; -39.37,314.96 -19.69,295.28 ; -39.37,354.33 -19.69,334.65 ; -39.37,433.07 -19.69,413.39 ; -39.37,472.44 -19.69,452.76 ; 19.69,-452.76 39.37,-472.44 ; 19.69,-413.39 39.37,-433.07 ; 19.69,-334.65 39.37,-354.33 ; 19.69,-295.28 39.37,-314.96 ; 59.06,-452.76 78.74,-472.44 ; 59.06,-413.39 78.74,-433.07 ; 59.06,-334.65 78.74,-354.33 ; 59.06,-295.28 78.74,-314.96 ; 59.06,295.28 78.74,314.96 ; 59.06,334.65 78.74,354.33 ; 59.06,413.39 78.74,433.07 ; 59.06,452.76 78.74,472.44 ; 98.43,295.28 118.11,314.96 ; 98.43,334.65 118.11,354.33 ; 98.43,413.39 118.11,433.07 ; 98.43,452.76 118.11,472.44 ; 137.8,-452.76 157.48,-472.44 ; 137.8,-413.39 157.48,-433.07 ; 137.8,-334.65 157.48,-354.33 ; 137.8,-295.28 157.48,-314.96 ; 177.17,-452.76 196.85,-472.44 ; 177.17,-413.39 196.85,-433.07 ; 177.17,-334.65 196.85,-354.33 ; 177.17,-295.28 196.85,-314.96 ; 177.17,295.28 196.85,314.96 ; 177.17,334.65 196.85,354.33 ; 177.17,413.39 196.85,433.07 ; 177.17,452.76 196.85,472.44 ; 216.54,295.28 236.22,314.96 ; 216.54,334.65 236.22,354.33 ; 216.54,413.39 236.22,433.07 ; 216.54,452.76 236.22,472.44 ; 295.28,-216.54 314.96,-236.22 ; 295.28,-177.17 314.96,-196.85 ; 295.28,-98.43 314.96,-118.11 ; 295.28,-59.06 314.96,-78.74 ; 295.28,19.69 314.96,39.37 ; 295.28,59.06 314.96,78.74 ; 295.28,137.8 314.96,157.48 ; 295.28,177.17 314.96,196.85 ; 334.65,-374.02 354.33,-393.7 ; 334.65,-334.65 354.33,-354.33 ; 334.65,-216.54 354.33,-236.22 ; 334.65,-177.17 354.33,-196.85 ; 334.65,-98.43 354.33,-118.11 ; 334.65,-59.06 354.33,-78.74 ; 334.65,19.69 354.33,39.37 ; 334.65,59.06 354.33,78.74 ; 334.65,137.8 354.33,157.48 ; 334.65,177.17 354.33,196.85 ; 334.65,413.39 354.33,433.07 ; 374.02,-452.76 393.7,-472.44 ; 374.02,413.39 393.7,433.07 ; 413.39,-452.76 433.07,-472.44 ; 413.39,-216.54 433.07,-236.22 ; 413.39,-177.17 433.07,-196.85 ; 413.39,-98.43 433.07,-118.11 ; 413.39,-59.06 433.07,-78.74 ; 413.39,19.69 433.07,39.37 ; 413.39,59.06 433.07,78.74 ; 413.39,137.8 433.07,157.48 ; 413.39,177.17 433.07,196.85 ; 413.39,413.39 433.07,433.07 ; 452.76,-413.39 472.44,-433.07 ; 452.76,-216.54 472.44,-236.22 ; 452.76,-177.17 472.44,-196.85 ; 452.76,-98.43 472.44,-118.11 ; 452.76,-59.06 472.44,-78.74 ; 452.76,19.69 472.44,39.37 ; 452.76,59.06 472.44,78.74 ; 452.76,137.8 472.44,157.48 ; 452.76,177.17 472.44,196.85 ; 452.76,295.28 472.44,314.96